# Altium schematic symbol library IC_TI.SCHLIB: 1162 symbols (part 5 of 8) (continued)
## SN74HC11PW (continued)

## SN74HC14D
designator U?
Integrated Circuit; Manufacturer_Name: Texas Instruments; Manufacturer_Part_Number: SN74HC14D; Datasheet Link: http://www.ti.com/lit/ds/symlink/sn74hc14.pdf; Height: 1.75mm; Mouser Part Number: 595-SN74HC14D; Mouser Price/Stock: https://www.mouser.com/Search/Refine.aspx?Keyword=595-SN74HC14D; RS Part Number: 6631938P; RS Price/Stock: http://uk.rs-online.com/web/p/products/6631938P
footprint SOIC14_1.27
pins: 1 1A, 2 1Y, 3 2A, 4 2Y, 5 3A, 6 3Y, 7 GND (power), 8 4Y, 9 4A, 10 5Y, 11 5A, 12 6Y, 13 6A, 14 VCC (power)

## SN74HC14QPWRQ1
designator U?
Integrated Circuit; Manufacturer_Name: Texas Instruments; Manufacturer_Part_Number: SN74HC14QPWRQ1; Datasheet Link: http://www.ti.com/lit/ds/symlink/sn74hc14-q1.pdf; Height: 1.2mm; Mouser Part Number: 595-SN74HC14QPWRQ1; Mouser Price/Stock: https://www.mouser.com/Search/Refine.aspx?Keyword=595-SN74HC14QPWRQ1; RS Part Number: 6607376; RS Price/Stock: http://uk.rs-online.com/web/p/products/6607376
footprint TSSOP14_0.65 (TSOP, 14-Leads, Body 5.00x4.40mm, Pitch 0.65mm, Thermal Pad 2.31x2.46mm, IPC Low Density)
pins: 1 1A, 2 1Y, 3 2A, 4 2Y, 5 3A, 6 3Y, 7 GND (power), 8 4Y, 9 4A, 10 5Y, 11 5A, 12 6Y, 13 6A, 14 VCC (power)

## SN74HC32D
designator U?
Integrated Circuit; Manufacturer_Name: Texas Instruments; Manufacturer_Part_Number: SN74HC32D; Datasheet Link: http://www.ti.com/lit/gpn/sn74hc32; Mouser Part Number: 595-SN74HC32D; Mouser Price/Stock: https://www.mouser.com/Search/Refine.aspx?Keyword=595-SN74HC32D; RS Part Number: 0528448; RS Price/Stock: http://uk.rs-online.com/web/p/products/0528448
footprint SOIC14_1.27
pins: 1 1A, 2 1B, 3 1Y, 4 2A, 5 2B, 6 2Y, 7 GND, 8 3Y, 9 3A, 10 3B, 11 4Y, 12 4A, 13 4B, 14 VCC

## SN74HC74D
designator U?
Integrated Circuit; Manufacturer_Name: Texas Instruments; Manufacturer_Part_Number: SN74HC74D; Datasheet Link: http://www.ti.com/lit/gpn/sn74hc74; Mouser Part Number: 595-SN74HC74D; Mouser Price/Stock: https://www.mouser.com/Search/Refine.aspx?Keyword=595-SN74HC74D; RS Part Number: 0526559; RS Price/Stock: http://uk.rs-online.com/web/p/products/0526559
footprint SOIC14_1.27
pins: 1 1~CLR, 2 1D, 3 1CLK, 4 1~PRE, 5 1Q, 6 1~Q, 7 GND, 8 2~Q, 9 2Q, 10 2~PRE, 11 2CLK, 12 2D, 13 2~CLR, 14 VCC

## SN74HC74PWR
designator U?
Integrated Circuit; Manufacturer_Name: Texas Instruments; Datasheet Link: http://www.ti.com/lit/ds/symlink/sn74hc74.pdf; Height: 1.2mm; Manufacturer_Part_Number: SN74HC74PWR; Mouser Part Number: 595-SN74HC74PWR; Mouser Price/Stock: https://www.mouser.com/Search/Refine.aspx?Keyword=595-SN74HC74PWR; RS Part Number: 1627396; RS Price/Stock: http://uk.rs-online.com/web/p/products/1627396
footprint TSSOP14_0.65 (TSOP, 14-Leads, Body 5.00x4.40mm, Pitch 0.65mm, Thermal Pad 2.31x2.46mm, IPC Low Density)
pins: 1 1~{CLR}, 2 1D, 3 1CLK, 4 1~{PRE}, 5 1Q, 6 1~{Q}, 7 GND, 8 2~{Q}, 9 2Q, 10 2~{PRE}, 11 2CLK, 12 2D, 13 2~{CLR}, 14 VCC

## SN74HC109D
designator U?
Integrated Circuit; Manufacturer_Name: Texas Instruments; Manufacturer_Part_Number: SN74HC109D; Datasheet Link: http://www.ti.com/lit/ds/symlink/sn74hc109.pdf; Height: 1.75mm; Mouser Part Number: 595-SN74HC109D; Mouser Price/Stock: https://www.mouser.com/Search/Refine.aspx?Keyword=595-SN74HC109D; RS Part Number: 0404556; RS Price/Stock: http://uk.rs-online.com/web/p/products/0404556
footprint SOIC16_1.27
pins: 1 1~{CLR} (in), 2 1J (in), 3 1~{K} (in), 4 1CLK (in), 5 1~{PRE} (in), 6 1Q (out), 7 1~{Q} (out), 8 GND (power), 9 2~{Q} (out), 10 2Q (out), 11 2~{PRE} (in), 12 2CLK (in), 13 2~{K} (in), 14 2J (in), 15 2~{CLR} (in), 16 VCC (power)

## SN74HC112D
designator U?
Integrated Circuit; Manufacturer_Name: Texas Instruments; Manufacturer_Part_Number: SN74HC112D; Datasheet Link: http://www.ti.com/lit/ds/symlink/sn74hc112.pdf; Height: 1.75mm; Mouser Part Number: 595-SN74HC112D; Mouser Price/Stock: https://www.mouser.com/Search/Refine.aspx?Keyword=595-SN74HC112D; RS Part Number: 1789199; RS Price/Stock: http://uk.rs-online.com/web/p/products/1789199
footprint SOIC16_1.27
pins: 1 1CLK (in), 2 1K (in), 3 1J (in), 4 ~{1PRE} (in), 5 1Q (out), 6 ~{1Q} (out), 7 ~{2Q} (out), 8 GND (power), 9 2Q (out), 10 ~{2PRE} (in), 11 2J (in), 12 2K (in), 13 2CLK (in), 14 ~{2CLR} (in), 15 ~{1CLR} (in), 16 VCC (power)

## SN74HC112N
designator U?
Integrated Circuit; Manufacturer_Name: Texas Instruments; Manufacturer_Part_Number: SN74HC112N; Datasheet Link: http://www.ti.com/lit/gpn/sn74hc112; Mouser Part Number: 595-SN74HC112N; Mouser Price/Stock: https://www.mouser.com/Search/Refine.aspx?Keyword=595-SN74HC112N; RS Part Number: 1449971; RS Price/Stock: http://uk.rs-online.com/web/p/products/1449971
footprint DIP16
pins: 1 1CLK, 2 1K, 3 1J, 4 1~PRE, 5 1Q, 6 1~Q, 7 2~Q, 8 GND, 9 2Q, 10 2~PRE, 11 2J, 12 2K, 13 2CLK, 14 2~CLR, 15 1~CLR, 16 VCC

## SN74HC125D
designator U?
Integrated Circuit; Manufacturer_Name: Texas Instruments; Manufacturer_Part_Number: SN74HC125D; Datasheet Link: http://www.ti.com/lit/ds/symlink/sn74hc125.pdf; Height: 1.75mm; Mouser Part Number: 595-SN74HC125D; Mouser Price/Stock: https://www.mouser.com/Search/Refine.aspx?Keyword=595-SN74HC125D; RS Part Number: 6631919P; RS Price/Stock: http://uk.rs-online.com/web/p/products/6631919P
footprint SOIC14_1.27
pins: 1 1~{OE}, 2 1A, 3 1Y, 4 2~{OE}, 5 2A, 6 2Y, 7 GND (power), 8 3Y, 9 3A, 10 3~{OE}, 11 4Y, 12 4A, 13 4~{OE}, 14 VCC (power)

## SN74HC125N
designator U?
Integrated Circuit; Manufacturer_Name: Texas Instruments; Manufacturer_Part_Number: SN74HC125N; Datasheet Link: http://www.ti.com/lit/gpn/sn74hc125; Mouser Part Number: 595-SN74HC125N; Mouser Price/Stock: https://www.mouser.com/Search/Refine.aspx?Keyword=595-SN74HC125N; RS Part Number: 3332833; RS Price/Stock: http://uk.rs-online.com/web/p/products/3332833
footprint DIP14
pins: 1 1~OE, 2 1A, 3 1Y, 4 2~OE, 5 2A, 6 2Y, 7 GND, 8 3Y, 9 3A, 10 3~OE, 11 4Y, 12 4A, 13 4~OE, 14 VCC

## SN74HC125PWR
designator U?
Integrated Circuit; Manufacturer_Name: Texas Instruments; Datasheet Link: https://componentsearchengine.com/Datasheets/2/SN74HC125PWR.pdf; Height: 1.2mm; Manufacturer_Part_Number: SN74HC125PWR; Mouser Part Number: 595-SN74HC125PWR; Mouser Price/Stock: https://www.mouser.com/Search/Refine.aspx?Keyword=595-SN74HC125PWR
footprint TSSOP14_0.65 (TSOP, 14-Leads, Body 5.00x4.40mm, Pitch 0.65mm, Thermal Pad 2.31x2.46mm, IPC Low Density)
pins: 1 1~{OE}, 2 1A, 3 1Y, 4 2~{OE}, 5 2A, 6 2Y, 7 GND, 8 3Y, 9 3A, 10 3~{OE}, 11 4Y, 12 4A, 13 4~{OE}, 14 VCC

## SN74HC132D
designator U?
Integrated Circuit; Manufacturer_Name: Texas Instruments; Manufacturer_Part_Number: SN74HC132D; Datasheet Link: http://www.ti.com/lit/gpn/sn74hc132; Mouser Part Number: 595-SN74HC132D; Mouser Price/Stock: https://www.mouser.com/Search/Refine.aspx?Keyword=595-SN74HC132D; RS Part Number: 0527473; RS Price/Stock: http://uk.rs-online.com/web/p/products/0527473
footprint SOIC14_1.27
pins: 1 1A, 2 1B, 3 1Y, 4 2A, 5 2B, 6 2Y, 7 GND, 8 3Y, 9 3A, 10 3B, 11 4Y, 12 4A, 13 4B, 14 VCC

## SN74HC138DR
designator U?
Integrated Circuit; Manufacturer_Name: Texas Instruments; Manufacturer_Part_Number: SN74HC138DR; Datasheet Link: http://www.ti.com/lit/ds/symlink/sn74hc138.pdf; Height: 1.75mm; Mouser Part Number: 595-SN74HC138DR; Mouser Price/Stock: https://www.mouser.com/Search/Refine.aspx?Keyword=595-SN74HC138DR; RS Part Number: 6628109; RS Price/Stock: http://uk.rs-online.com/web/p/products/6628109
footprint SOIC16_1.27
pins: 1 A, 2 B, 3 C, 4 ~{G2A}, 5 ~{G2B}, 6 G1, 7 Y7, 8 GND (power), 9 Y6, 10 Y5, 11 Y4, 12 Y3, 13 Y2, 14 Y1, 15 Y0, 16 VCC (power)

## SN74HC138PW
designator U?
Integrated Circuit; Manufacturer_Name: Texas Instruments; Manufacturer_Part_Number: SN74HC138PW; Datasheet Link: http://www.ti.com/lit/gpn/sn74hc138; Mouser Part Number: 595-SN74HC138PW; Mouser Price/Stock: https://www.mouser.com/Search/Refine.aspx?Keyword=595-SN74HC138PW; RS Part Number: 6631928; RS Price/Stock: http://uk.rs-online.com/web/p/products/6631928
footprint TSSOP16_0.65 (Shrink Small Outline; 16 Leads; Body Width 4.4 mm; Pitch 0.65 mm)
pins: 1 A, 2 B, 3 C, 4 ~G2A, 5 ~G2B, 6 G1, 7 Y7, 8 GND, 9 Y6, 10 Y5, 11 Y4, 12 Y3, 13 Y2, 14 Y1, 15 Y0, 16 VCC

## SN74HC139D
designator U?
Integrated Circuit; Manufacturer_Name: Texas Instruments; Manufacturer_Part_Number: SN74HC139D; Datasheet Link: http://www.ti.com/lit/ds/symlink/sn74hc139.pdf; Height: 1.75mm; Mouser Part Number: 595-SN74HC139D; Mouser Price/Stock: https://www.mouser.com/Search/Refine.aspx?Keyword=595-SN74HC139D; RS Part Number: 6631922P; RS Price/Stock: http://uk.rs-online.com/web/p/products/6631922P
footprint SOIC16_1.27
pins: 1 1~{G}, 2 1A, 3 1B, 4 1Y0, 5 1Y1, 6 1Y2, 7 1Y3, 8 GND (power), 9 2Y3, 10 2Y2, 11 2Y1, 12 2Y0, 13 2B, 14 2A, 15 2~{G}, 16 VCC (power)

## SN74HC139N
designator U?
Integrated Circuit; Manufacturer_Name: Texas Instruments; Manufacturer_Part_Number: SN74HC139N; Datasheet Link: http://www.ti.com/lit/gpn/sn74hc139; Mouser Part Number: 595-SN74HC139N; Mouser Price/Stock: https://www.mouser.com/Search/Refine.aspx?Keyword=595-SN74HC139N; RS Part Number: 3332861; RS Price/Stock: http://uk.rs-online.com/web/p/products/3332861
footprint DIP16
pins: 1 1~G, 2 1A, 3 1B, 4 1Y0, 5 1Y1, 6 1Y2, 7 1Y3, 8 GND, 9 2Y3, 10 2Y2, 11 2Y1, 12 2Y0, 13 2B, 14 2A, 15 2~G, 16 VCC

## SN74HC139NSR
designator U?
Integrated Circuit; Manufacturer_Name: Texas Instruments; Manufacturer_Part_Number: SN74HC139NSR; Datasheet Link: http://www.ti.com/lit/gpn/sn74hc139; Height: 2mm; Mouser Part Number: 595-SN74HC139NSR; Mouser Price/Stock: https://www.mouser.com/Search/Refine.aspx?Keyword=595-SN74HC139NSR
footprint SOP16W_1.27
pins: 1 1~{G}, 2 1A, 3 1B, 4 1Y0, 5 1Y1, 6 1Y2, 7 1Y3, 8 GND, 9 2Y3, 10 2Y2, 11 2Y1, 12 2Y0, 13 2B, 14 2A, 15 2~{G}, 16 VCC

## SN74HC148D
designator U?
Integrated Circuit; Manufacturer_Name: Texas Instruments; Manufacturer_Part_Number: SN74HC148D; Datasheet Link: http://www.ti.com/lit/ds/symlink/sn74hc148.pdf; Height: 1.75mm; Mouser Part Number: 595-SN74HC148D; Mouser Price/Stock: https://www.mouser.com/Search/Refine.aspx?Keyword=595-SN74HC148D; RS Part Number: 6631934P; RS Price/Stock: http://uk.rs-online.com/web/p/products/6631934P
footprint SOIC16_1.27
pins: 1 4, 2 5, 3 6, 4 7, 5 EI, 6 A2, 7 A1, 8 GND (power), 9 A0, 10 0, 11 1, 12 2, 13 3, 14 GS, 15 EO, 16 VCC (power)

## SN74HC148N
designator U?
Integrated Circuit; Manufacturer_Name: Texas Instruments; Manufacturer_Part_Number: SN74HC148N; Datasheet Link: http://www.ti.com/lit/gpn/sn74hc148; Mouser Part Number: 595-SN74HC148N; Mouser Price/Stock: https://www.mouser.com/Search/Refine.aspx?Keyword=595-SN74HC148N; RS Part Number: 0443053P; RS Price/Stock: http://uk.rs-online.com/web/p/products/0443053P
footprint DIP16
pins: 1 4, 2 5, 3 6, 4 7, 5 EI, 6 A2, 7 A1, 8 GND, 9 A0, 10 0, 11 1, 12 2, 13 3, 14 GS, 15 EO, 16 VCC

## SN74HC157D
designator U?
Integrated Circuit; Manufacturer_Name: Texas Instruments; Manufacturer_Part_Number: SN74HC157D; Datasheet Link: http://www.ti.com/lit/ds/symlink/sn74hc157.pdf; Height: 1.75mm; Mouser Part Number: 595-SN74HC157D; Mouser Price/Stock: https://www.mouser.com/Search/Refine.aspx?Keyword=595-SN74HC157D; RS Part Number: 0528208; RS Price/Stock: http://uk.rs-online.com/web/p/products/0528208
footprint SOIC16_1.27
pins: 1 ~{A}/B, 2 1A, 3 1B, 4 1Y, 5 2A, 6 2B, 7 2Y, 8 GND (power), 9 3Y, 10 3B, 11 3A, 12 4Y, 13 4B, 14 4A, 15 ~{G}, 16 VCC (power)

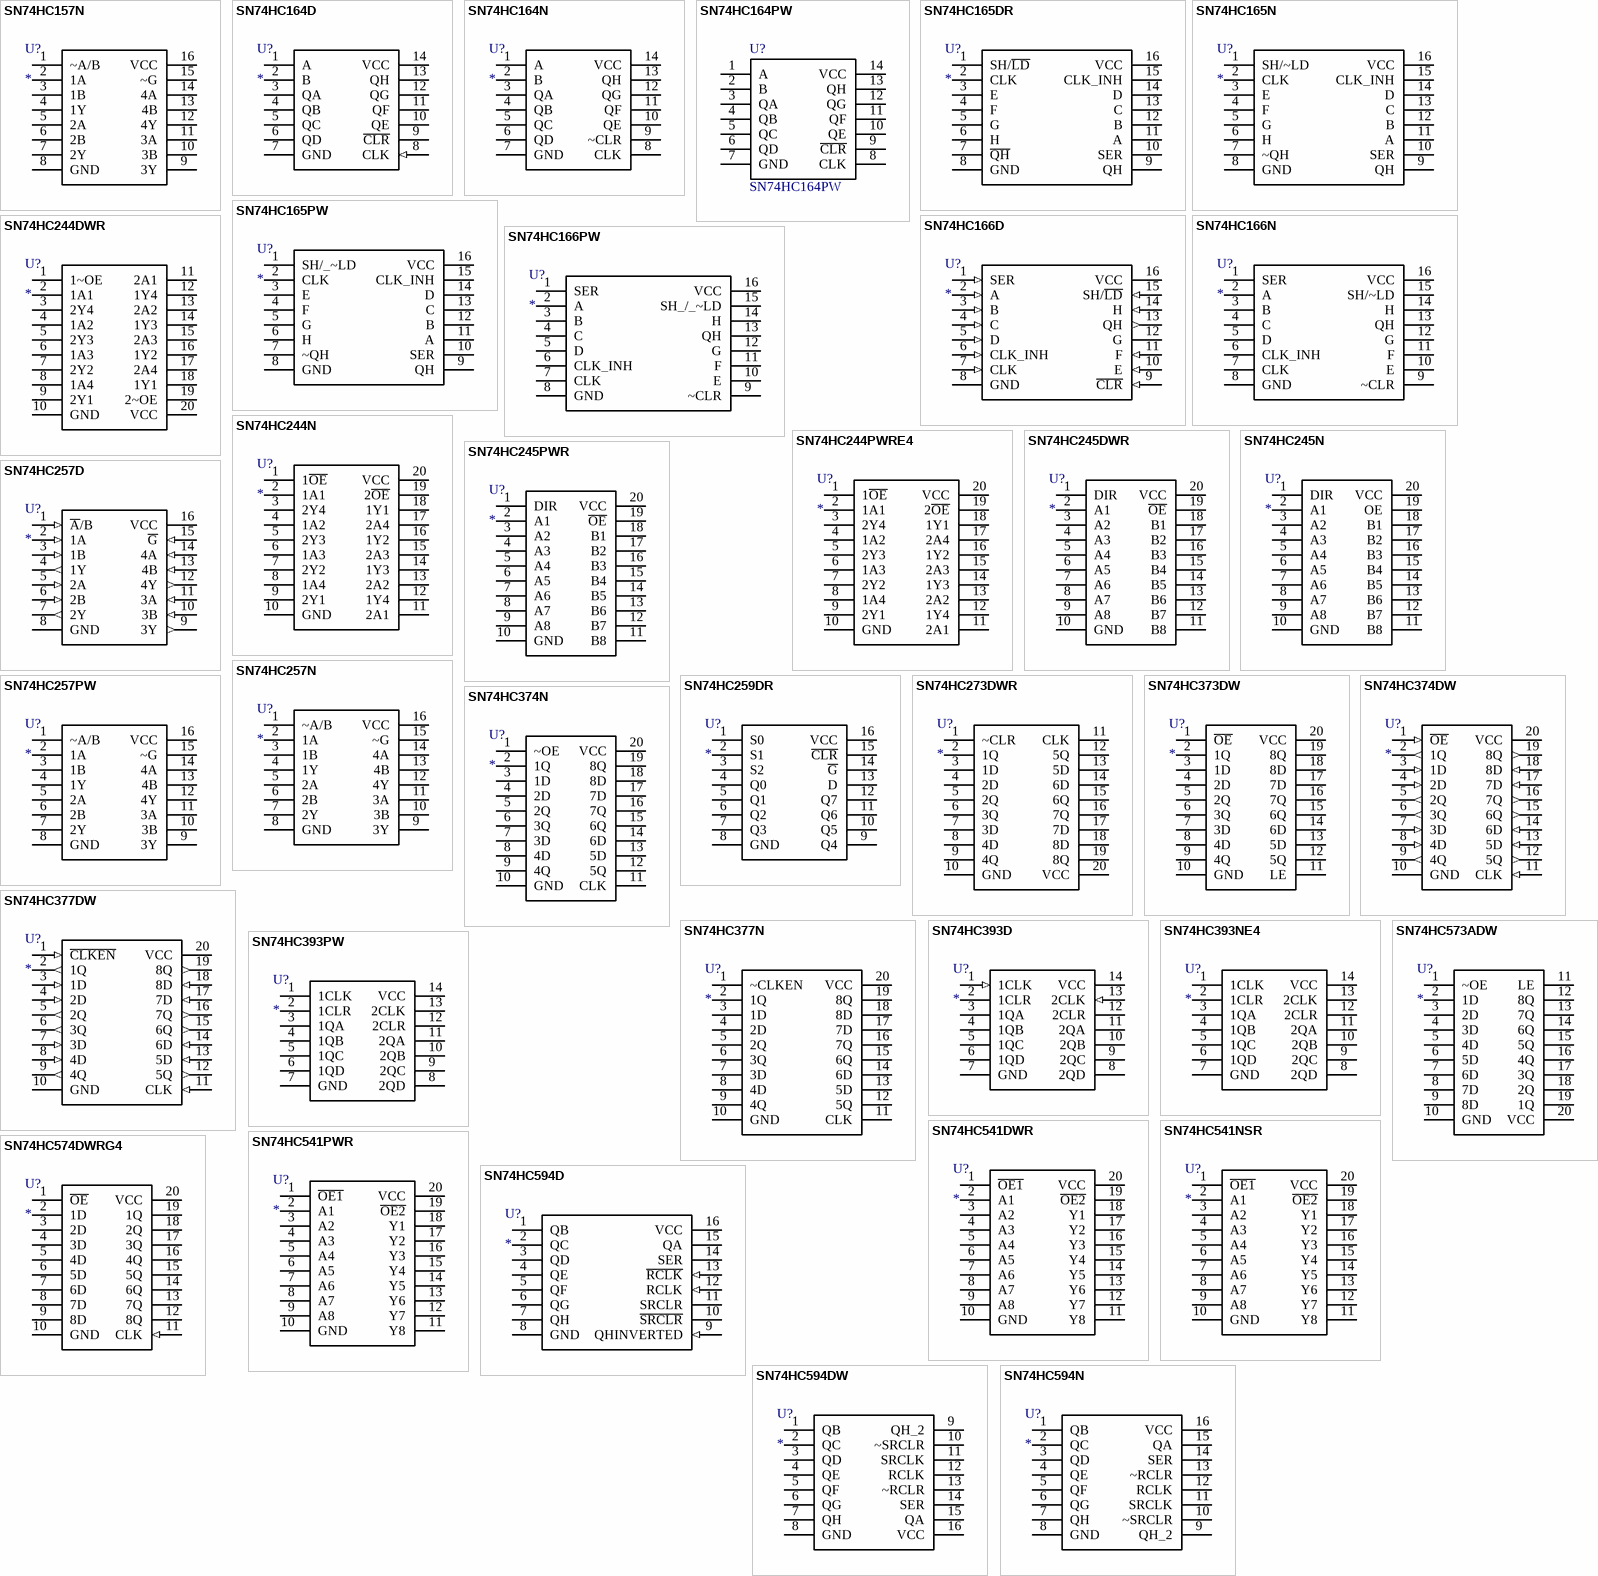
[diagram p21: symbols SN74HC157N to SN74HC594N]

## SN74HC157N
designator U?
Integrated Circuit; Manufacturer_Name: Texas Instruments; Manufacturer_Part_Number: SN74HC157N; Datasheet Link: http://www.ti.com/lit/gpn/sn74hc157; Mouser Part Number: 595-SN74HC157N; Mouser Price/Stock: https://www.mouser.com/Search/Refine.aspx?Keyword=595-SN74HC157N; RS Part Number: 2175588; RS Price/Stock: http://uk.rs-online.com/web/p/products/2175588
footprint DIP16
pins: 1 ~A/B, 2 1A, 3 1B, 4 1Y, 5 2A, 6 2B, 7 2Y, 8 GND, 9 3Y, 10 3B, 11 3A, 12 4Y, 13 4B, 14 4A, 15 ~G, 16 VCC

## SN74HC164D
designator U?
Integrated Circuit; Manufacturer_Name: Texas Instruments; Manufacturer_Part_Number: SN74HC164D; Datasheet Link: http://www.ti.com/lit/ds/symlink/sn74hc164.pdf; Height: 1.75mm; Mouser Part Number: 595-SN74HC164D; Mouser Price/Stock: https://www.mouser.com/Search/Refine.aspx?Keyword=595-SN74HC164D; RS Part Number: 1792049; RS Price/Stock: http://uk.rs-online.com/web/p/products/1792049
footprint SOIC14_1.27
pins: 1 A, 2 B, 3 QA, 4 QB, 5 QC, 6 QD, 7 GND (power), 8 CLK (in), 9 ~{CLR}, 10 QE, 11 QF, 12 QG, 13 QH, 14 VCC (power)

## SN74HC164N
designator U?
Integrated Circuit; Manufacturer_Name: Texas Instruments; Manufacturer_Part_Number: SN74HC164N; Datasheet Link: http://www.ti.com/lit/gpn/sn74hc164; Mouser Part Number: 595-SN74HC164N; Mouser Price/Stock: https://www.mouser.com/Search/Refine.aspx?Keyword=595-SN74HC164N; RS Part Number: 2175594; RS Price/Stock: http://uk.rs-online.com/web/p/products/2175594
footprint DIP14
pins: 1 A, 2 B, 3 QA, 4 QB, 5 QC, 6 QD, 7 GND, 8 CLK, 9 ~CLR, 10 QE, 11 QF, 12 QG, 13 QH, 14 VCC

## SN74HC164PW
designator U?
Integrated Circuit; Manufacturer_Name: Texas Instruments; Datasheet Link: http://www.ti.com/lit/ds/symlink/sn74hc164.pdf; Height: 1.2mm; Manufacturer_Part_Number: SN74HC164PW; Mouser Part Number: 595-SN74HC164PW; Mouser Price/Stock: https://www.mouser.com/Search/Refine.aspx?Keyword=595-SN74HC164PW; RS Part Number: 1449973; RS Price/Stock: http://uk.rs-online.com/web/p/products/1449973
footprint TSSOP14_0.65 (TSOP, 14-Leads, Body 5.00x4.40mm, Pitch 0.65mm, Thermal Pad 2.31x2.46mm, IPC Low Density)
pins: 1 A, 2 B, 3 QA, 4 QB, 5 QC, 6 QD, 7 GND, 8 CLK, 9 ~{CLR}, 10 QE, 11 QF, 12 QG, 13 QH, 14 VCC

## SN74HC165DR
designator U?
Integrated Circuit; Manufacturer_Name: Texas Instruments; Manufacturer_Part_Number: SN74HC165DR; Datasheet Link: http://www.ti.com/lit/ds/symlink/sn74hc165.pdf; Height: 1.75mm; Mouser Part Number: 595-SN74HC165DR; Mouser Price/Stock: https://www.mouser.com/Search/Refine.aspx?Keyword=595-SN74HC165DR; RS Part Number: 6628137P; RS Price/Stock: http://uk.rs-online.com/web/p/products/6628137P
footprint SOIC16_1.27
pins: 1 SH/~{LD}, 2 CLK, 3 E, 4 F, 5 G, 6 H, 7 ~{QH}, 8 GND, 9 QH, 10 SER, 11 A, 12 B, 13 C, 14 D, 15 CLK_INH, 16 VCC

## SN74HC165N
designator U?
Integrated Circuit; Manufacturer_Name: Texas Instruments; Manufacturer_Part_Number: SN74HC165N; Datasheet Link: http://componentsearchengine.com/Datasheets/3/SN74HC165N.pdf; Mouser Part Number: 595-SN74HC165N; Mouser Price/Stock: https://www.mouser.com/Search/Refine.aspx?Keyword=595-SN74HC165N; RS Part Number: 2175601; RS Price/Stock: http://uk.rs-online.com/web/p/products/2175601
footprint DIP16
pins: 1 SH/~LD, 2 CLK, 3 E, 4 F, 5 G, 6 H, 7 ~QH, 8 GND, 9 QH, 10 SER, 11 A, 12 B, 13 C, 14 D, 15 CLK_INH, 16 VCC

## SN74HC165PW
designator U?
Integrated Circuit; Manufacturer_Name: Texas Instruments; Manufacturer_Part_Number: SN74HC165PW; Datasheet Link: http://www.ti.com/lit/gpn/sn74hc165; Mouser Part Number: 595-SN74HC165PW; Mouser Price/Stock: https://www.mouser.com/Search/Refine.aspx?Keyword=595-SN74HC165PW; RS Part Number: 6631984; RS Price/Stock: http://uk.rs-online.com/web/p/products/6631984
footprint TSSOP16_0.65 (Shrink Small Outline; 16 Leads; Body Width 4.4 mm; Pitch 0.65 mm)
pins: 1 SH/_~LD, 2 CLK, 3 E, 4 F, 5 G, 6 H, 7 ~QH, 8 GND, 9 QH, 10 SER, 11 A, 12 B, 13 C, 14 D, 15 CLK_INH, 16 VCC

## SN74HC166D
designator U?
Integrated Circuit; Manufacturer_Name: Texas Instruments; Manufacturer_Part_Number: SN74HC166D; Datasheet Link: http://www.ti.com/lit/ds/symlink/sn74hc166.pdf; Height: 1.75mm; Mouser Part Number: 595-SN74HC166D; Mouser Price/Stock: https://www.mouser.com/Search/Refine.aspx?Keyword=595-SN74HC166D; RS Part Number: 6631988; RS Price/Stock: http://uk.rs-online.com/web/p/counters-shift-registers/6631988/?source=DS
footprint SOIC16_1.27
pins: 1 SER (in), 2 A (in), 3 B (in), 4 C (in), 5 D (in), 6 CLK_INH (in), 7 CLK (in), 8 GND (power), 9 ~{CLR} (in), 10 E (in), 11 F (in), 12 G (power), 13 QH (out), 14 H (in), 15 SH/~{LD} (in), 16 VCC (power)

## SN74HC166N
designator U?
Integrated Circuit; Manufacturer_Name: Texas Instruments; Manufacturer_Part_Number: SN74HC166N; Datasheet Link: http://www.ti.com/lit/gpn/sn74hc166; Mouser Part Number: 595-SN74HC166N; Mouser Price/Stock: https://www.mouser.com/Search/Refine.aspx?Keyword=595-SN74HC166N; RS Part Number: 0443104P; RS Price/Stock: http://uk.rs-online.com/web/p/products/0443104P
footprint DIP16
pins: 1 SER, 2 A, 3 B, 4 C, 5 D, 6 CLK_INH, 7 CLK, 8 GND, 9 ~CLR, 10 E, 11 F, 12 G, 13 QH, 14 H, 15 SH/~LD, 16 VCC

## SN74HC166PW
designator U?
Integrated Circuit; Manufacturer_Name: Texas Instruments; Manufacturer_Part_Number: SN74HC166PW; Mouser Part Number: 595-SN74HC166PW; RS Part Number: 6631997; RS Price/Stock: http://uk.rs-online.com/web/p/products/6631997
footprint TSSOP16_0.65 (Shrink Small Outline; 16 Leads; Body Width 4.4 mm; Pitch 0.65 mm)
pins: 1 SER, 2 A, 3 B, 4 C, 5 D, 6 CLK_INH, 7 CLK, 8 GND, 9 ~CLR, 10 E, 11 F, 12 G, 13 QH, 14 H, 15 SH_/_~LD, 16 VCC

## SN74HC244DWR
designator U?
Integrated Circuit; Manufacturer_Name: Texas Instruments; Manufacturer_Part_Number: SN74HC244DWR; Datasheet Link: http://www.ti.com/lit/gpn/sn74hc244; Mouser Part Number: 595-SN74HC244DWR; Mouser Price/Stock: https://www.mouser.com/Search/Refine.aspx?Keyword=595-SN74HC244DWR; RS Part Number: 1456893; RS Price/Stock: http://uk.rs-online.com/web/p/products/1456893
footprint SOIC20W_1.27
pins: 1 1~OE, 2 1A1, 3 2Y4, 4 1A2, 5 2Y3, 6 1A3, 7 2Y2, 8 1A4, 9 2Y1, 10 GND, 11 2A1, 12 1Y4, 13 2A2, 14 1Y3, 15 2A3, 16 1Y2, 17 2A4, 18 1Y1, 19 2~OE, 20 VCC

## SN74HC244N
designator U?
Integrated Circuit; Manufacturer_Name: Texas Instruments; Manufacturer_Part_Number: SN74HC244N; Datasheet Link: http://www.ti.com/lit/ds/symlink/sn74hc244.pdf; Height: 5.08mm; Mouser Part Number: 595-SN74HC244N; Mouser Price/Stock: https://www.mouser.com/Search/Refine.aspx?Keyword=595-SN74HC244N; RS Part Number: 9232489; RS Price/Stock: http://uk.rs-online.com/web/p/products/9232489
footprint DIP20-A
pins: 1 1~{OE}, 2 1A1, 3 2Y4, 4 1A2, 5 2Y3, 6 1A3, 7 2Y2, 8 1A4, 9 2Y1, 10 GND (power), 11 2A1, 12 1Y4, 13 2A2, 14 1Y3, 15 2A3, 16 1Y2, 17 2A4, 18 1Y1, 19 2~{OE}, 20 VCC (power)

## SN74HC244PWRE4
designator U?
Integrated Circuit; Manufacturer_Name: Texas Instruments; Manufacturer_Part_Number: SN74HC244PWRE4; Datasheet Link: http://www.ti.com/lit/ds/symlink/sn74hc244.pdf; Height: 1.2mm; Mouser Part Number: 595-SN74HC244PWRE4; Mouser Price/Stock: https://www.mouser.com/Search/Refine.aspx?Keyword=595-SN74HC244PWRE4
footprint TSSOP20_0.65 (TSOP, 20-Leads, Body 6.6x4.5mm (max), Pitch 0.65mm, IPC Medium Density)
pins: 1 1~{OE}, 2 1A1, 3 2Y4, 4 1A2, 5 2Y3, 6 1A3, 7 2Y2, 8 1A4, 9 2Y1, 10 GND, 11 2A1, 12 1Y4, 13 2A2, 14 1Y3, 15 2A3, 16 1Y2, 17 2A4, 18 1Y1, 19 2~{OE}, 20 VCC

## SN74HC245DWR
designator U?
Integrated Circuit; Manufacturer_Name: Texas Instruments; Manufacturer_Part_Number: SN74HC245DWR; Datasheet Link: http://www.ti.com/lit/ds/symlink/sn74hc245.pdf; Height: 2.65mm; Mouser Part Number: 595-SN74HC245DWR; Mouser Price/Stock: https://www.mouser.com/Search/Refine.aspx?Keyword=595-SN74HC245DWR; RS Part Number: 0526628; RS Price/Stock: http://uk.rs-online.com/web/p/products/0526628
footprint SOIC20W_1.27
pins: 1 DIR, 2 A1, 3 A2, 4 A3, 5 A4, 6 A5, 7 A6, 8 A7, 9 A8, 10 GND (power), 11 B8, 12 B7, 13 B6, 14 B5, 15 B4, 16 B3, 17 B2, 18 B1, 19 ~{OE}, 20 VCC (power)

## SN74HC245N
designator U?
Integrated Circuit; Manufacturer_Name: Texas Instruments; Manufacturer_Part_Number: SN74HC245N; Datasheet Link: http://www.ti.com/lit/ds/symlink/sn74hc245.pdf; Height: 5.08mm; Mouser Part Number: 595-SN74HC245N; Mouser Price/Stock: https://www.mouser.com/Search/Refine.aspx?Keyword=595-SN74HC245N; RS Part Number: 0443160P; RS Price/Stock: http://uk.rs-online.com/web/p/products/0443160P
footprint DIP20-A
pins: 1 DIR, 2 A1, 3 A2, 4 A3, 5 A4, 6 A5, 7 A6, 8 A7, 9 A8, 10 GND (power), 11 B8, 12 B7, 13 B6, 14 B5, 15 B4, 16 B3, 17 B2, 18 B1, 19 OE, 20 VCC (power)

## SN74HC245PWR
designator U?
Integrated Circuit; Manufacturer_Name: Texas Instruments; Manufacturer_Part_Number: SN74HC245PWR; Datasheet Link: http://www.ti.com/lit/gpn/sn74hc245; Height: 1.2mm; Mouser Part Number: 595-SN74HC245PWR; Mouser Price/Stock: https://www.mouser.com/Search/Refine.aspx?Keyword=595-SN74HC245PWR
footprint TSSOP20_0.65 (TSOP, 20-Leads, Body 6.6x4.5mm (max), Pitch 0.65mm, IPC Medium Density)
pins: 1 DIR, 2 A1, 3 A2, 4 A3, 5 A4, 6 A5, 7 A6, 8 A7, 9 A8, 10 GND, 11 B8, 12 B7, 13 B6, 14 B5, 15 B4, 16 B3, 17 B2, 18 B1, 19 ~{OE}, 20 VCC

## SN74HC257D
designator U?
Integrated Circuit; Manufacturer_Name: Texas Instruments; Manufacturer_Part_Number: SN74HC257D; Datasheet Link: http://www.ti.com/lit/ds/symlink/sn74hc257.pdf; Height: 1.75mm; Mouser Part Number: 595-SN74HC257D; RS Part Number: 6632048; RS Price/Stock: http://uk.rs-online.com/web/p/multiplexer-switch-ics/6632048/?source=DS
footprint SOIC16_1.27
pins: 1 ~{A}/B (in), 2 1A (in), 3 1B (in), 4 1Y (out), 5 2A (in), 6 2B (in), 7 2Y (out), 8 GND (power), 9 3Y (out), 10 3B (in), 11 3A (in), 12 4Y (out), 13 4B (in), 14 4A (in), 15 ~{G} (in), 16 VCC (power)

## SN74HC257N
designator U?
Integrated Circuit; Manufacturer_Name: Texas Instruments; Manufacturer_Part_Number: SN74HC257N; Datasheet Link: http://www.ti.com/lit/gpn/sn74hc257; Mouser Part Number: 595-SN74HC257N; Mouser Price/Stock: https://www.mouser.com/Search/Refine.aspx?Keyword=595-SN74HC257N
footprint DIP16
pins: 1 ~A/B, 2 1A, 3 1B, 4 1Y, 5 2A, 6 2B, 7 2Y, 8 GND, 9 3Y, 10 3B, 11 3A, 12 4Y, 13 4B, 14 4A, 15 ~G, 16 VCC

## SN74HC257PW
designator U?
Integrated Circuit; Manufacturer_Name: Texas Instruments; Manufacturer_Part_Number: SN74HC257PW; Mouser Part Number: 595-SN74HC257PW; RS Part Number: 8095794P; RS Price/Stock: http://uk.rs-online.com/web/p/products/8095794P
footprint TSSOP16_0.65 (Shrink Small Outline; 16 Leads; Body Width 4.4 mm; Pitch 0.65 mm)
pins: 1 ~A/B, 2 1A, 3 1B, 4 1Y, 5 2A, 6 2B, 7 2Y, 8 GND, 9 3Y, 10 3B, 11 3A, 12 4Y, 13 4B, 14 4A, 15 ~G, 16 VCC

## SN74HC259DR
designator U?
Integrated Circuit; Manufacturer_Name: Texas Instruments; Manufacturer_Part_Number: SN74HC259DR; Datasheet Link: http://docs-emea.rs-online.com/webdocs/0b82/0900766b80b8244a.pdf; Height: 1.75mm; Mouser Part Number: 595-SN74HC259DR; Mouser Price/Stock: https://www.mouser.com/Search/Refine.aspx?Keyword=595-SN74HC259DR; RS Part Number: 0526379; RS Price/Stock: http://uk.rs-online.com/web/p/products/0526379
footprint SOIC16_1.27
pins: 1 S0, 2 S1, 3 S2, 4 Q0, 5 Q1, 6 Q2, 7 Q3, 8 GND (power), 9 Q4, 10 Q5, 11 Q6, 12 Q7, 13 D, 14 ~{G}, 15 ~{CLR}, 16 VCC (power)

## SN74HC273DWR
designator U?
Integrated Circuit; Manufacturer_Name: Texas Instruments; Manufacturer_Part_Number: SN74HC273DWR; Datasheet Link: http://www.ti.com/lit/gpn/sn74hc273; Mouser Part Number: 595-SN74HC273DWR; Mouser Price/Stock: https://www.mouser.com/Search/Refine.aspx?Keyword=595-SN74HC273DWR; RS Part Number: 0528167; RS Price/Stock: http://uk.rs-online.com/web/p/products/0528167
footprint SOIC20W_1.27
pins: 1 ~CLR, 2 1Q, 3 1D, 4 2D, 5 2Q, 6 3Q, 7 3D, 8 4D, 9 4Q, 10 GND, 11 CLK, 12 5Q, 13 5D, 14 6D, 15 6Q, 16 7Q, 17 7D, 18 8D, 19 8Q, 20 VCC

## SN74HC373DW
designator U?
Integrated Circuit; Manufacturer_Name: Texas Instruments; Manufacturer_Part_Number: SN74HC373DW; Datasheet Link: http://www.ti.com/lit/ds/symlink/sn74hc373.pdf; Height: 2.65mm; Mouser Part Number: 595-SN74HC373DW; Mouser Price/Stock: https://www.mouser.com/Search/Refine.aspx?Keyword=595-SN74HC373DW; RS Part Number: 6632082P; RS Price/Stock: http://uk.rs-online.com/web/p/products/6632082P
footprint SOIC20W_1.27
pins: 1 ~{OE}, 2 1Q, 3 1D, 4 2D, 5 2Q, 6 3Q, 7 3D, 8 4D, 9 4Q, 10 GND (power), 11 LE, 12 5Q, 13 5D, 14 6D, 15 6Q, 16 7Q, 17 7D, 18 8D, 19 8Q, 20 VCC (power)

## SN74HC374DW
designator U?
Integrated Circuit; Manufacturer_Name: Texas Instruments; Manufacturer_Part_Number: SN74HC374DW; Datasheet Link: http://www.ti.com/lit/ds/symlink/sn74hc374.pdf; Height: 2.65mm; Mouser Part Number: 595-SN74HC374DW; Mouser Price/Stock: https://www.mouser.com/Search/Refine.aspx?Keyword=595-SN74HC374DW; RS Part Number: 0527609; RS Price/Stock: http://uk.rs-online.com/web/p/products/0527609
footprint SOIC20W_1.27
pins: 1 ~{OE} (in), 2 1Q (out), 3 1D (in), 4 2D (in), 5 2Q (out), 6 3Q (out), 7 3D (in), 8 4D (in), 9 4Q (out), 10 GND (power), 11 CLK (in), 12 5Q (out), 13 5D (in), 14 6D (in), 15 6Q (out), 16 7Q (out), 17 7D (in), 18 8D (in), 19 8Q (out), 20 VCC (power)

## SN74HC374N
designator U?
Integrated Circuit; Manufacturer_Name: Texas Instruments; Manufacturer_Part_Number: SN74HC374N; Datasheet Link: http://componentsearchengine.com/Datasheets/1/SN74HC374N.pdf; Mouser Part Number: 595-SN74HC374N; Mouser Price/Stock: https://www.mouser.com/Search/Refine.aspx?Keyword=595-SN74HC374N; RS Part Number: 3333189; RS Price/Stock: http://uk.rs-online.com/web/p/products/3333189
footprint DIP20
pins: 1 ~OE, 2 1Q, 3 1D, 4 2D, 5 2Q, 6 3Q, 7 3D, 8 4D, 9 4Q, 10 GND, 11 CLK, 12 5Q, 13 5D, 14 6D, 15 6Q, 16 7Q, 17 7D, 18 8D, 19 8Q, 20 VCC
